# Altium footprint library 电阻封装库.PcbLib: 218 footprints (part 9 of 14)
Each footprint in its own frame and in the unit in brackets; x right, y up, seen from the top. Pads: shape width x height; smd on the part's side, far side on the other; paste and mask are expansions set on the pad; w line width, h text height; cw(c..) or ccw(c..) is an arc to the next point about the centre after c.
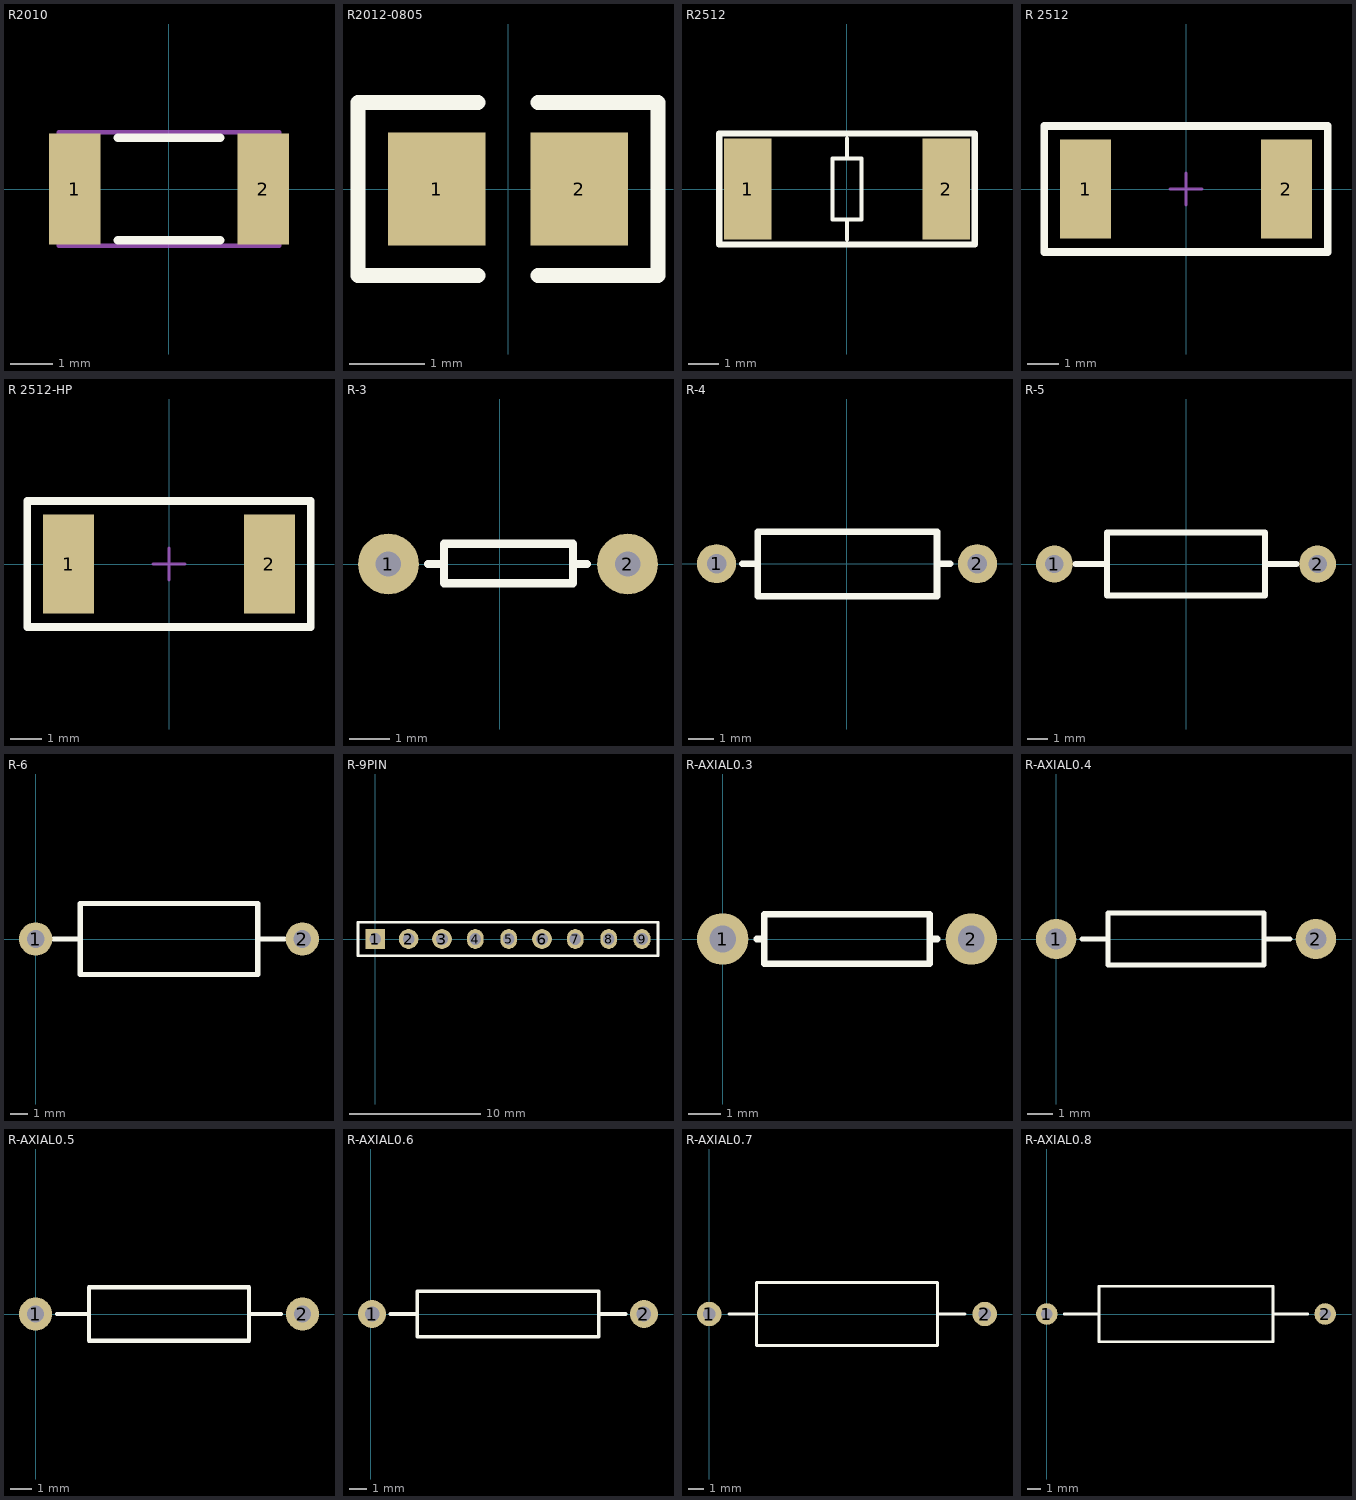
[diagram p8: the footprints below, top view; thin cyan lines are the x and y axes]

## R2010 [mm] "3/4W"
height 0.9
pads (2):
  rect 1.2x2.6 smd: 1(-2.2,0) 2(2.2,0)
Top Overlay:
  lines w0.2: -1.2,-1.2 1.2,-1.2 ; -1.2,1.2 1.2,1.2
Mechanical 13:
  lines w0.1: -2.575,-1.325 2.575,-1.325 2.575,1.325 -2.575,1.325 -2.575,-1.325
3D body "User Library-res2010.STEP": height 0.57, standoff -0.05, extent -3,-1.35 3,1.35

## R2012-0805 [mm] "Thermistor; 2 Leads"
pads (2):
  rect 1.3x1.5 smd: 1(-0.95,0) 2(0.95,0)
Top Overlay:
  lines w0.2: -0.4,-1.15 -2,-1.15 -2,1.15 -0.4,1.15 ; 0.4,-1.15 2,-1.15 2,1.15 0.4,1.15

## R2512 [mil]
pads (2):
  rect 61x129.92 smd: 1(-127.5,0) 2(127.5,0)
Top Overlay:
  lines w5.12: 0,-64.96 0,-39.37 ; 0,39.37 0,64.96 ; -18.7,-39.37 -18.7,39.37 18.7,39.37 18.7,-39.37 -18.7,-39.37
  lines w7.87: -164,-71 164,-71 164,71 -164,71 -164,-71
3D body "User Library-res2512_body.step": height 24.44, standoff 0, extent -124.39,-63 124.4,63

## R 2512 [mm] "1W贴片电阻"
pads (2):
  rect 1.65x3.2 smd: 1(-3.24,0) 2(3.24,0)
Top Overlay:
  lines w0.254: -4.572,-2.032 4.572,-2.032 4.572,2.032 -4.572,2.032 -4.572,-2.032
Mechanical 15:
  lines w0.1: -0.508,0 0.508,0 ; 0,-0.508 0,0.508
3D body "R 2512.STEP": height 0.55, standoff -0.02, extent -3.2,-1.6 3.2,1.6

## R 2512-HP [mm] "1W高精度贴片电阻"
pads (2):
  rect 1.65x3.2 smd: 1(-3.24,0) 2(3.24,0)
Top Overlay:
  lines w0.254: -4.572,-2.032 4.572,-2.032 4.572,2.032 -4.572,2.032 -4.572,-2.032
Mechanical 15:
  lines w0.1: -0.508,0 0.508,0 ; 0,-0.508 0,0.508
3D body "R 2512-HP.STEP": height 0.55, standoff -0.02, extent -3.2,-1.6 3.2,1.6

## R-3 [mil]
pads (2):
  round 60 hole 25: 1(-110,0) 2(126,0)
Top Overlay:
  lines w8: -71,0 -55,0 ; 86,0 72,0 ; 72,0 72,20 -55,20 -55,-19 72,-19 72,0
3D body "User Library-Res_1-8w_9_1.STEP": height 70.43, standoff -83.11, extent -118.98,-36 132.98,34.87

## R-4 [mil]
pads (2):
  round 60 hole 30: 1(-200,0) 2(200,0)
Top Overlay:
  lines w10: -160.63,0 -137.01,0 ; 138.58,0 158.27,0 ; -137.01,48.99 -137,49 ; -137,49 138,49 138,-50 -137.01,-50 -137.01,48.99
3D body "AXIAL-0.4-0.25W.STEP": height 88.74, standoff -118.35, extent -210,-50 213.63,49.22

## R-5 [mil]
pads (2):
  round 70 hole 35: 1(-250,0) 2(250,0)
Top Overlay:
  lines w12: -210,0 -150,0 ; 150,0 210,0 ; -150,-60 150,-60 150,60 -150,60 -150,-60
3D body "User Library-Res50-Axial 0_5W-10K.STEP": height 149.09, standoff -220, extent -264.76,-73.81 264.77,73.82

## R-6 [mil]
pads (2):
  round 75 hole 40: 1(0,0) 2(600,0)
Top Overlay:
  lines w12: 40,0 100,0 ; 500,0 560,0 ; 100,-80 500,-80 500,80 100,80 100,-80
3D body "User Library-RES 1W -H  L=11 D=4,5 d=0,8 Pin2Pin=15,24.STEP": height 180.75, standoff -204.82, extent -15.74,-88.58 615.75,88.6

## R-9PIN [mm]
pads (9):
  rect 1.5x1.5 hole 0.9: 1(0,0)
  round 1.5 hole 0.9: 2(2.54,0) 3(5.08,0) 6(12.7,0)
  oval 1.27x1.5 hole 0.9: 4(7.62,0) 5(10.16,0) 7(15.24,0) 8(17.78,0) 9(20.32,0)
Top Overlay:
  lines w0.2: -1.321,-1.27 -1.321,1.27 21.539,1.27 21.539,-1.27 -1.321,-1.27
3D body "pai zu.STEP": height 5.3, standoff -3.2, extent -1.012,-0.635 21.488,0.615

## R-AXIAL0.3 [mil]
pads (2):
  round 62 hole 32: 1(0,0) 2(300,0)
Top Overlay:
  lines w8: 41,0 50,0 ; 259,0 250,0 ; 250,0 250,30 50,30 50,-30 250,-30 250,0

## R-AXIAL0.4 [mil]
pads (2):
  round 62 hole 32: 1(0,0) 2(400,0)
Top Overlay:
  lines w8: 40,0 80,0 ; 320,0 360,0 ; 80,-40 80,40 320,40 320,-40 80,-40

## R-AXIAL0.5 [mil]
pads (2):
  round 62 hole 32: 1(0,0) 2(500,0)
Top Overlay:
  lines w8: 40,0 100,0 ; 400,0 460,0 ; 100,-50 100,50 400,50 400,-50 100,-50

## R-AXIAL0.6 [mil]
pads (2):
  round 62 hole 32: 1(2.5,0) 2(602.5,0)
Top Overlay:
  lines w8: 42.5,0 102.5,0 ; 502.5,0 562.5,0 ; 102.5,-50 502.5,-50 502.5,50 102.5,50 102.5,-50

## R-AXIAL0.7 [mil]
pads (2):
  round 62 hole 32: 1(0,0) 2(700,0)
Top Overlay:
  lines w8: 50,0 120,0 ; 580,0 650,0 ; 120,-80 120,80 580,80 580,-80 120,-80

## R-AXIAL0.8 [mil]
pads (2):
  round 62 hole 32: 1(0,0) 2(800,0)
Top Overlay:
  lines w8: 50,0 150,0 ; 650,0 750,0 ; 150,-80 650,-80 650,80 150,80 150,-80